# Altium footprint library WR-TBL_Pluggable PCB Header_3.81mm.PcbLib: 200 footprints (part 11 of 13)
Each footprint in its own frame and in the unit in brackets; x right, y up, seen from the top. Pads: shape width x height; smd on the part's side, far side on the other; paste and mask are expansions set on the pad; w line width, h text height; cw(c..) or ccw(c..) is an arc to the next point about the centre after c.
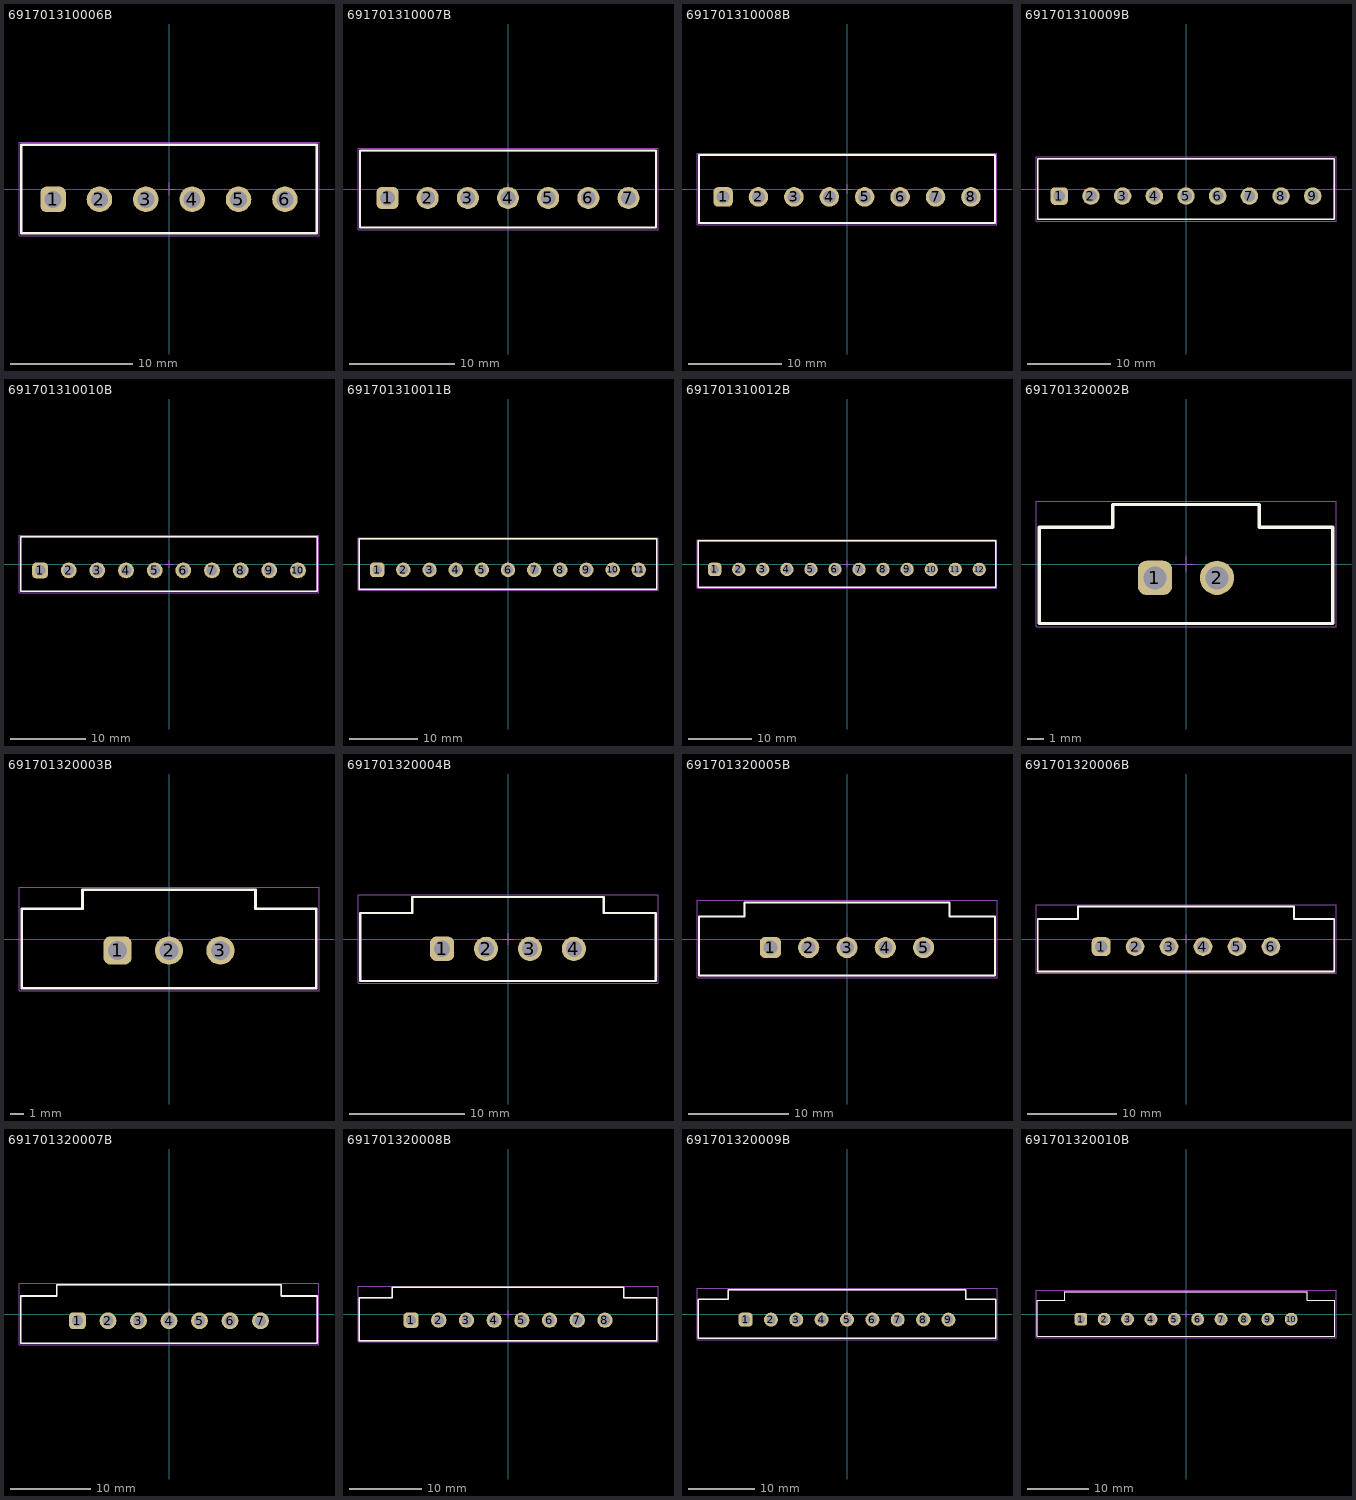
[diagram p10: the footprints below, top view; thin cyan lines are the x and y axes]

## 691701310006B [mm] "Vertical PCB Header THR Type, pitch 3.81mm, 06p"
height 9.2
pads (6):
  rrect50% 2.1x2.1 hole 1.4: 1(-9.525,-0.85)
  round 2.1 hole 1.4: 2(-5.715,-0.85) 3(-1.905,-0.85) 4(1.905,-0.85) 5(5.715,-0.85) 6(9.525,-0.85)
Top Overlay:
  lines w0.2: -12.125,-3.65 -12.125,3.65 12.125,3.65 12.125,-3.65 -12.125,-3.65
Top Designator:
  text ".Designator" at -7.498,-0.5 h1.5
Top Component Outline:
  lines w0.1: -12.125,-3.65 12.125,-3.65 12.125,3.65 -12.125,3.65 -12.125,-3.65
Top 3D Body:
  lines w0.1: -12.125,-3.65 -12.125,3.65 12.125,3.65 12.125,-3.65 -12.125,-3.65
Top Courtyard:
  lines w0.05: -12.325,-3.85 -12.325,3.85 12.325,3.85 12.325,-3.85 -12.325,-3.85
Top Component Center:
  lines w0.05: -0.5,0 0.5,0 ; 0,-0.5 0,0.5
3D body "691701310006B.stp": height 9.25, standoff -2.55, extent -12.125,-3.65 12.125,3.65

## 691701310007B [mm] "Vertical PCB Header THR Type, pitch 3.81mm, 07p"
height 9.2
pads (7):
  rrect50% 2.1x2.1 hole 1.4: 1(-11.43,-0.85)
  round 2.1 hole 1.4: 2(-7.62,-0.85) 3(-3.81,-0.85) 4(0,-0.85) 5(3.81,-0.85) 6(7.62,-0.85) 7(11.43,-0.85)
Top Overlay:
  lines w0.2: -14.03,-3.65 -14.03,3.65 14.03,3.65 14.03,-3.65 -14.03,-3.65
Top Designator:
  text ".Designator" at -7.498,-0.5 h1.5
Top Component Outline:
  lines w0.1: -14.03,-3.65 14.03,-3.65 14.03,3.65 -14.03,3.65 -14.03,-3.65
Top 3D Body:
  lines w0.1: -14.03,-3.65 -14.03,3.65 14.03,3.65 14.03,-3.65 -14.03,-3.65
Top Courtyard:
  lines w0.05: -14.23,-3.85 -14.23,3.85 14.23,3.85 14.23,-3.85 -14.23,-3.85
Top Component Center:
  lines w0.05: -0.5,0 0.5,0 ; 0,-0.5 0,0.5
3D body "691701310007B.stp": height 9.25, standoff -2.55, extent -14.03,-3.65 14.03,3.65

## 691701310008B [mm] "Vertical PCB Header THR Type, pitch 3.81mm, 08p"
height 9.2
pads (8):
  rrect50% 2.1x2.1 hole 1.4: 1(-13.335,-0.85)
  round 2.1 hole 1.4: 2(-9.525,-0.85) 3(-5.715,-0.85) 4(-1.905,-0.85) 5(1.905,-0.85) 6(5.715,-0.85) 7(9.525,-0.85) 8(13.335,-0.85)
Top Overlay:
  lines w0.2: -15.935,-3.65 15.935,-3.65 15.935,3.65 -15.935,3.65 -15.935,-3.65
Top Designator:
  text ".Designator" at -7.498,-0.5 h1.5
Top Component Outline:
  lines w0.1: -15.935,-3.65 -15.935,3.65 15.935,3.65 15.935,-3.65 -15.935,-3.65
Top 3D Body:
  lines w0.1: -15.935,-3.65 15.935,-3.65 15.935,3.65 -15.935,3.65 -15.935,-3.65
Top Courtyard:
  lines w0.05: -16.135,-3.85 16.135,-3.85 16.135,3.85 -16.135,3.85 -16.135,-3.85
Top Component Center:
  lines w0.05: -0.5,0 0.5,0 ; 0,-0.5 0,0.5
3D body "691701310008B.stp": height 9.25, standoff -2.55, extent -15.935,-3.65 15.935,3.65

## 691701310009B [mm] "Vertical PCB Header THR Type, pitch 3.81mm, 09p"
height 9.2
pads (9):
  rrect50% 2.1x2.1 hole 1.4: 1(-15.24,-0.85)
  round 2.1 hole 1.4: 2(-11.43,-0.85) 3(-7.62,-0.85) 4(-3.81,-0.85) 5(0,-0.85) 6(3.81,-0.85) 7(7.62,-0.85) 8(11.43,-0.85) 9(15.24,-0.85)
Top Overlay:
  lines w0.2: -17.84,-3.65 17.84,-3.65 17.84,3.65 -17.84,3.65 -17.84,-3.65
Top Designator:
  text ".Designator" at -7.498,-0.5 h1.5
Top Component Outline:
  lines w0.1: -17.84,-3.65 -17.84,3.65 17.84,3.65 17.84,-3.65 -17.84,-3.65
Top 3D Body:
  lines w0.1: -17.84,-3.65 17.84,-3.65 17.84,3.65 -17.84,3.65 -17.84,-3.65
Top Courtyard:
  lines w0.05: -18.04,-3.85 18.04,-3.85 18.04,3.85 -18.04,3.85 -18.04,-3.85
Top Component Center:
  lines w0.05: -0.5,0 0.5,0 ; 0,-0.5 0,0.5
3D body "691701310009B.stp": height 9.25, standoff -2.55, extent -17.84,-3.65 17.84,3.65

## 691701310010B [mm] "Vertical PCB Header THR Type, pitch 3.81mm, 10p"
height 9.2
pads (10):
  rrect50% 2.1x2.1 hole 1.4: 1(-17.145,-0.85)
  round 2.1 hole 1.4: 2(-13.335,-0.85) 3(-9.525,-0.85) 4(-5.715,-0.85) 5(-1.905,-0.85) 6(1.905,-0.85) 7(5.715,-0.85) 8(9.525,-0.85) 9(13.335,-0.85) 10(17.145,-0.85)
Top Overlay:
  lines w0.2: -19.745,-3.65 -19.745,3.65 19.745,3.65 19.745,-3.65 -19.745,-3.65
Top Designator:
  text ".Designator" at -7.498,-0.5 h1.5
Top Component Outline:
  lines w0.1: -19.745,-3.65 19.745,-3.65 19.745,3.65 -19.745,3.65 -19.745,-3.65
Top 3D Body:
  lines w0.1: -19.745,-3.65 -19.745,3.65 19.745,3.65 19.745,-3.65 -19.745,-3.65
Top Courtyard:
  lines w0.05: -19.945,-3.85 -19.945,3.85 19.945,3.85 19.945,-3.85 -19.945,-3.85
Top Component Center:
  lines w0.05: -0.5,0 0.5,0 ; 0,-0.5 0,0.5
3D body "691701310010B.stp": height 9.25, standoff -2.55, extent -19.745,-3.65 19.745,3.65

## 691701310011B [mm] "Vertical PCB Header THR Type, pitch 3.81mm, 11p"
height 9.2
pads (11):
  rrect50% 2.1x2.1 hole 1.4: 1(-19.05,-0.85)
  round 2.1 hole 1.4: 2(-15.24,-0.85) 3(-11.43,-0.85) 4(-7.62,-0.85) 5(-3.81,-0.85) 6(0,-0.85) 7(3.81,-0.85) 8(7.62,-0.85) 9(11.43,-0.85) 10(15.24,-0.85) 11(19.05,-0.85)
Top Overlay:
  lines w0.2: -21.65,-3.65 21.65,-3.65 21.65,3.65 -21.65,3.65 -21.65,-3.65
Top Designator:
  text ".Designator" at -7.498,-0.5 h1.5
Top Component Outline:
  lines w0.1: -21.65,-3.65 -21.65,3.65 21.65,3.65 21.65,-3.65 -21.65,-3.65
Top 3D Body:
  lines w0.1: -21.65,-3.65 21.65,-3.65 21.65,3.65 -21.65,3.65 -21.65,-3.65
Top Courtyard:
  lines w0.05: -21.85,-3.85 21.85,-3.85 21.85,3.85 -21.85,3.85 -21.85,-3.85
Top Component Center:
  lines w0.05: -0.5,0 0.5,0 ; 0,-0.5 0,0.5
3D body "691701310011B.stp": height 9.25, standoff -2.55, extent -21.65,-3.65 21.65,3.65

## 691701310012B [mm] "Vertical PCB Header THR Type, pitch 3.81mm, 12p"
height 9.2
pads (12):
  rrect50% 2.1x2.1 hole 1.4: 1(-20.955,-0.85)
  round 2.1 hole 1.4: 2(-17.145,-0.85) 3(-13.335,-0.85) 4(-9.525,-0.85) 5(-5.715,-0.85) 6(-1.905,-0.85) 7(1.905,-0.85) 8(5.715,-0.85) 9(9.525,-0.85) 10(13.335,-0.85) 11(17.145,-0.85) 12(20.955,-0.85)
Top Overlay:
  lines w0.2: -23.555,-3.65 -23.555,3.65 23.555,3.65 23.555,-3.65 -23.555,-3.65
Top Designator:
  text ".Designator" at -7.498,-0.5 h1.5
Top Component Outline:
  lines w0.1: -23.555,-3.65 23.555,-3.65 23.555,3.65 -23.555,3.65 -23.555,-3.65
Top 3D Body:
  lines w0.1: -23.555,-3.65 -23.555,3.65 23.555,3.65 23.555,-3.65 -23.555,-3.65
Top Courtyard:
  lines w0.05: -23.755,-3.85 -23.755,3.85 23.755,3.85 23.755,-3.85 -23.755,-3.85
Top Component Center:
  lines w0.05: -0.5,0 0.5,0 ; 0,-0.5 0,0.5
3D body "691701310012B.stp": height 9.25, standoff -2.55, extent -23.555,-3.65 23.555,3.65

## 691701320002B [mm] "THR - 3,81mm - PCB Vertical Flange - 02p"
height 9.2
pads (2):
  rrect50% 2.1x2.1 hole 1.4: 1(-1.905,-0.85)
  round 2.1 hole 1.4: 2(1.905,-0.85)
Top Overlay:
  lines w0.2: -9.005,-3.65 9.005,-3.65 9.005,2.25 4.5,2.25 4.5,3.65 -4.5,3.65 -4.5,2.25 -9.005,2.25 -9.005,-3.65
Top Designator:
  text ".Designator" at -7.498,-0.5 h1.5
Top Component Outline:
  lines w0.1: -9.005,-3.65 -9.005,2.25 -4.5,2.25 -4.5,3.65 4.5,3.65 4.5,2.25 9.005,2.25 9.005,-3.65 -9.005,-3.65
Top 3D Body:
  lines w0.1: -9.005,-3.65 9.005,-3.65 9.005,2.25 4.5,2.25 4.5,3.65 -4.5,3.65 -4.5,2.25 -9.005,2.25 -9.005,-3.65
Top Courtyard:
  lines w0.05: -9.205,-3.85 9.205,-3.85 9.205,3.85 -9.205,3.85 -9.205,-3.85
Top Component Center:
  lines w0.05: -0.5,0 0.5,0 ; 0,-0.5 0,0.5
3D body "691701320002B.stp": height 9.25, standoff -2.55, extent -9.005,-3.65 9.005,3.65

## 691701320003B [mm] "THR - 3,81mm - PCB Vertical Flange - 03p"
height 9.2
pads (3):
  rrect50% 2.1x2.1 hole 1.4: 1(-3.81,-0.85)
  round 2.1 hole 1.4: 2(0,-0.85) 3(3.81,-0.85)
Top Overlay:
  lines w0.2: -10.91,-3.65 -10.91,2.25 -6.405,2.25 -6.405,3.65 6.405,3.65 6.405,2.25 10.91,2.25 10.91,-3.65 -10.91,-3.65
Top Designator:
  text ".Designator" at -7.498,-0.5 h1.5
Top Component Outline:
  lines w0.1: -10.91,-3.65 10.91,-3.65 10.91,2.25 6.405,2.25 6.405,3.65 -6.405,3.65 -6.405,2.25 -10.91,2.25 -10.91,-3.65
Top 3D Body:
  lines w0.1: -10.91,-3.65 -10.91,2.25 -6.405,2.25 -6.405,3.65 6.405,3.65 6.405,2.25 10.91,2.25 10.91,-3.65 -10.91,-3.65
Top Courtyard:
  lines w0.05: -11.11,-3.85 -11.11,3.85 11.11,3.85 11.11,-3.85 -11.11,-3.85
Top Component Center:
  lines w0.05: -0.5,0 0.5,0 ; 0,-0.5 0,0.5
3D body "691701320003B.stp": height 9.25, standoff -2.55, extent -10.91,-3.65 10.91,3.65

## 691701320004B [mm] "THR - 3,81mm - PCB Vertical Flange - 04p"
height 9.2
pads (4):
  rrect50% 2.1x2.1 hole 1.4: 1(-5.715,-0.85)
  round 2.1 hole 1.4: 2(-1.905,-0.85) 3(1.905,-0.85) 4(5.715,-0.85)
Top Overlay:
  lines w0.2: -12.815,-3.65 -12.815,2.25 -8.31,2.25 -8.31,3.65 8.31,3.65 8.31,2.25 12.815,2.25 12.815,-3.65 -12.815,-3.65
Top Designator:
  text ".Designator" at -7.498,-0.5 h1.5
Top Component Outline:
  lines w0.1: -12.815,-3.65 12.815,-3.65 12.815,2.25 8.31,2.25 8.31,3.65 -8.31,3.65 -8.31,2.25 -12.815,2.25 -12.815,-3.65
Top 3D Body:
  lines w0.1: -12.815,-3.65 -12.815,2.25 -8.31,2.25 -8.31,3.65 8.31,3.65 8.31,2.25 12.815,2.25 12.815,-3.65 -12.815,-3.65
Top Courtyard:
  lines w0.05: -13.015,-3.85 -13.015,3.85 13.015,3.85 13.015,-3.85 -13.015,-3.85
Top Component Center:
  lines w0.05: -0.5,0 0.5,0 ; 0,-0.5 0,0.5
3D body "691701320004B.stp": height 9.25, standoff -2.55, extent -12.815,-3.65 12.815,3.65

## 691701320005B [mm] "THR - 3,81mm - PCB Vertical Flange - 05p"
height 9.2
pads (5):
  rrect50% 2.1x2.1 hole 1.4: 1(-7.62,-0.85)
  round 2.1 hole 1.4: 2(-3.81,-0.85) 3(0,-0.85) 4(3.81,-0.85) 5(7.62,-0.85)
Top Overlay:
  lines w0.2: -14.72,-3.65 14.72,-3.65 14.72,2.25 10.215,2.25 10.215,3.65 -10.215,3.65 -10.215,2.25 -14.72,2.25 -14.72,-3.65
Top Designator:
  text ".Designator" at -7.498,-0.5 h1.5
Top Component Outline:
  lines w0.1: -14.72,-3.65 -14.72,2.25 -10.215,2.25 -10.215,3.65 10.215,3.65 10.215,2.25 14.72,2.25 14.72,-3.65 -14.72,-3.65
Top 3D Body:
  lines w0.1: -14.72,-3.65 14.72,-3.65 14.72,2.25 10.215,2.25 10.215,3.65 -10.215,3.65 -10.215,2.25 -14.72,2.25 -14.72,-3.65
Top Courtyard:
  lines w0.05: -14.92,-3.85 14.92,-3.85 14.92,3.85 -14.92,3.85 -14.92,-3.85
Top Component Center:
  lines w0.05: -0.5,0 0.5,0 ; 0,-0.5 0,0.5
3D body "691701320005B.stp": height 9.25, standoff -2.55, extent -14.72,-3.65 14.72,3.65

## 691701320006B [mm] "THR - 3,81mm - PCB Vertical Flange - 06p"
height 9.2
pads (6):
  rrect50% 2.1x2.1 hole 1.4: 1(-9.525,-0.85)
  round 2.1 hole 1.4: 2(-5.715,-0.85) 3(-1.905,-0.85) 4(1.905,-0.85) 5(5.715,-0.85) 6(9.525,-0.85)
Top Overlay:
  lines w0.2: -16.625,-3.65 -16.625,2.25 -12.12,2.25 -12.12,3.65 12.12,3.65 12.12,2.25 16.625,2.25 16.625,-3.65 -16.625,-3.65
Top Designator:
  text ".Designator" at -7.498,-0.5 h1.5
Top Component Outline:
  lines w0.1: -16.625,-3.65 16.625,-3.65 16.625,2.25 12.12,2.25 12.12,3.65 -12.12,3.65 -12.12,2.25 -16.625,2.25 -16.625,-3.65
Top 3D Body:
  lines w0.1: -16.625,-3.65 -16.625,2.25 -12.12,2.25 -12.12,3.65 12.12,3.65 12.12,2.25 16.625,2.25 16.625,-3.65 -16.625,-3.65
Top Courtyard:
  lines w0.05: -16.825,-3.85 -16.825,3.85 16.825,3.85 16.825,-3.85 -16.825,-3.85
Top Component Center:
  lines w0.05: -0.5,0 0.5,0 ; 0,-0.5 0,0.5
3D body "691701320006B.stp": height 9.25, standoff -2.55, extent -16.625,-3.65 16.625,3.65

## 691701320007B [mm] "THR - 3,81mm - PCB Vertical Flange - 07p"
height 9.2
pads (7):
  rrect50% 2.1x2.1 hole 1.4: 1(-11.43,-0.85)
  round 2.1 hole 1.4: 2(-7.62,-0.85) 3(-3.81,-0.85) 4(0,-0.85) 5(3.81,-0.85) 6(7.62,-0.85) 7(11.43,-0.85)
Top Overlay:
  lines w0.2: -18.53,-3.65 -18.53,2.25 -14.025,2.25 -14.025,3.65 14.025,3.65 14.025,2.25 18.53,2.25 18.53,-3.65 -18.53,-3.65
Top Designator:
  text ".Designator" at -7.498,-0.5 h1.5
Top Component Outline:
  lines w0.1: -18.53,-3.65 18.53,-3.65 18.53,2.25 14.025,2.25 14.025,3.65 -14.025,3.65 -14.025,2.25 -18.53,2.25 -18.53,-3.65
Top 3D Body:
  lines w0.1: -18.53,-3.65 -18.53,2.25 -14.025,2.25 -14.025,3.65 14.025,3.65 14.025,2.25 18.53,2.25 18.53,-3.65 -18.53,-3.65
Top Courtyard:
  lines w0.05: -18.73,-3.85 -18.73,3.85 18.73,3.85 18.73,-3.85 -18.73,-3.85
Top Component Center:
  lines w0.05: -0.5,0 0.5,0 ; 0,-0.5 0,0.5
3D body "691701320007B.stp": height 9.25, standoff -2.55, extent -18.53,-3.65 18.53,3.65

## 691701320008B [mm] "THR - 3,81mm - PCB Vertical Flange - 08p"
height 9.2
pads (8):
  rrect50% 2.1x2.1 hole 1.4: 1(-13.335,-0.85)
  round 2.1 hole 1.4: 2(-9.525,-0.85) 3(-5.715,-0.85) 4(-1.905,-0.85) 5(1.905,-0.85) 6(5.715,-0.85) 7(9.525,-0.85) 8(13.335,-0.85)
Top Overlay:
  lines w0.2: -20.435,-3.65 -20.435,2.25 -15.93,2.25 -15.93,3.65 15.93,3.65 15.93,2.25 20.435,2.25 20.435,-3.65 -20.435,-3.65
Top Designator:
  text ".Designator" at -7.498,-0.5 h1.5
Top Component Outline:
  lines w0.1: -20.435,-3.65 20.435,-3.65 20.435,2.25 15.93,2.25 15.93,3.65 -15.93,3.65 -15.93,2.25 -20.435,2.25 -20.435,-3.65
Top 3D Body:
  lines w0.1: -20.435,-3.65 -20.435,2.25 -15.93,2.25 -15.93,3.65 15.93,3.65 15.93,2.25 20.435,2.25 20.435,-3.65 -20.435,-3.65
Top Courtyard:
  lines w0.05: -20.635,-3.85 -20.635,3.85 20.635,3.85 20.635,-3.85 -20.635,-3.85
Top Component Center:
  lines w0.05: -0.5,0 0.5,0 ; 0,-0.5 0,0.5
3D body "691701320008B.stp": height 9.25, standoff -2.55, extent -20.435,-3.65 20.435,3.65

## 691701320009B [mm] "THR - 3,81mm - PCB Vertical Flange - 09p"
height 9.2
pads (9):
  rrect50% 2.1x2.1 hole 1.4: 1(-15.24,-0.85)
  round 2.1 hole 1.4: 2(-11.43,-0.85) 3(-7.62,-0.85) 4(-3.81,-0.85) 5(0,-0.85) 6(3.81,-0.85) 7(7.62,-0.85) 8(11.43,-0.85) 9(15.24,-0.85)
Top Overlay:
  lines w0.2: -22.34,-3.65 -22.34,2.25 -17.835,2.25 -17.835,3.65 17.835,3.65 17.835,2.25 22.34,2.25 22.34,-3.65 -22.34,-3.65
Top Designator:
  text ".Designator" at -7.498,-0.5 h1.5
Top Component Outline:
  lines w0.1: -22.34,-3.65 22.34,-3.65 22.34,2.25 17.835,2.25 17.835,3.65 -17.835,3.65 -17.835,2.25 -22.34,2.25 -22.34,-3.65
Top 3D Body:
  lines w0.1: -22.34,-3.65 -22.34,2.25 -17.835,2.25 -17.835,3.65 17.835,3.65 17.835,2.25 22.34,2.25 22.34,-3.65 -22.34,-3.65
Top Courtyard:
  lines w0.05: -22.54,-3.85 -22.54,3.85 22.54,3.85 22.54,-3.85 -22.54,-3.85
Top Component Center:
  lines w0.05: -0.5,0 0.5,0 ; 0,-0.5 0,0.5
3D body "691701320009B.stp": height 9.25, standoff -2.55, extent -22.34,-3.65 22.34,3.65

## 691701320010B [mm] "THR - 3,81mm - PCB Vertical Flange - 10p"
height 9.2
pads (10):
  rrect50% 2.1x2.1 hole 1.4: 1(-17.145,-0.85)
  round 2.1 hole 1.4: 2(-13.335,-0.85) 3(-9.525,-0.85) 4(-5.715,-0.85) 5(-1.905,-0.85) 6(1.905,-0.85) 7(5.715,-0.85) 8(9.525,-0.85) 9(13.335,-0.85) 10(17.145,-0.85)
Top Overlay:
  lines w0.2: -24.245,-3.65 24.245,-3.65 24.245,2.25 19.74,2.25 19.74,3.65 -19.74,3.65 -19.74,2.25 -24.245,2.25 -24.245,-3.65
Top Designator:
  text ".Designator" at -7.498,-0.5 h1.5
Top Component Outline:
  lines w0.1: -24.245,-3.65 -24.245,2.25 -19.74,2.25 -19.74,3.65 19.74,3.65 19.74,2.25 24.245,2.25 24.245,-3.65 -24.245,-3.65
Top 3D Body:
  lines w0.1: -24.245,-3.65 24.245,-3.65 24.245,2.25 19.74,2.25 19.74,3.65 -19.74,3.65 -19.74,2.25 -24.245,2.25 -24.245,-3.65
Top Courtyard:
  lines w0.05: -24.445,-3.85 24.445,-3.85 24.445,3.85 -24.445,3.85 -24.445,-3.85
Top Component Center:
  lines w0.05: -0.5,0 0.5,0 ; 0,-0.5 0,0.5
3D body "691701320010B.stp": height 9.25, standoff -2.55, extent -24.245,-3.65 24.245,3.65